# Altium footprint library PcbLib1.PcbLib: 38 footprints (part 2 of 3)
Each footprint in its own frame and in the unit in brackets; x right, y up, seen from the top. Pads: shape width x height; smd on the part's side, far side on the other; paste and mask are expansions set on the pad; w line width, h text height; cw(c..) or ccw(c..) is an arc to the next point about the centre after c.
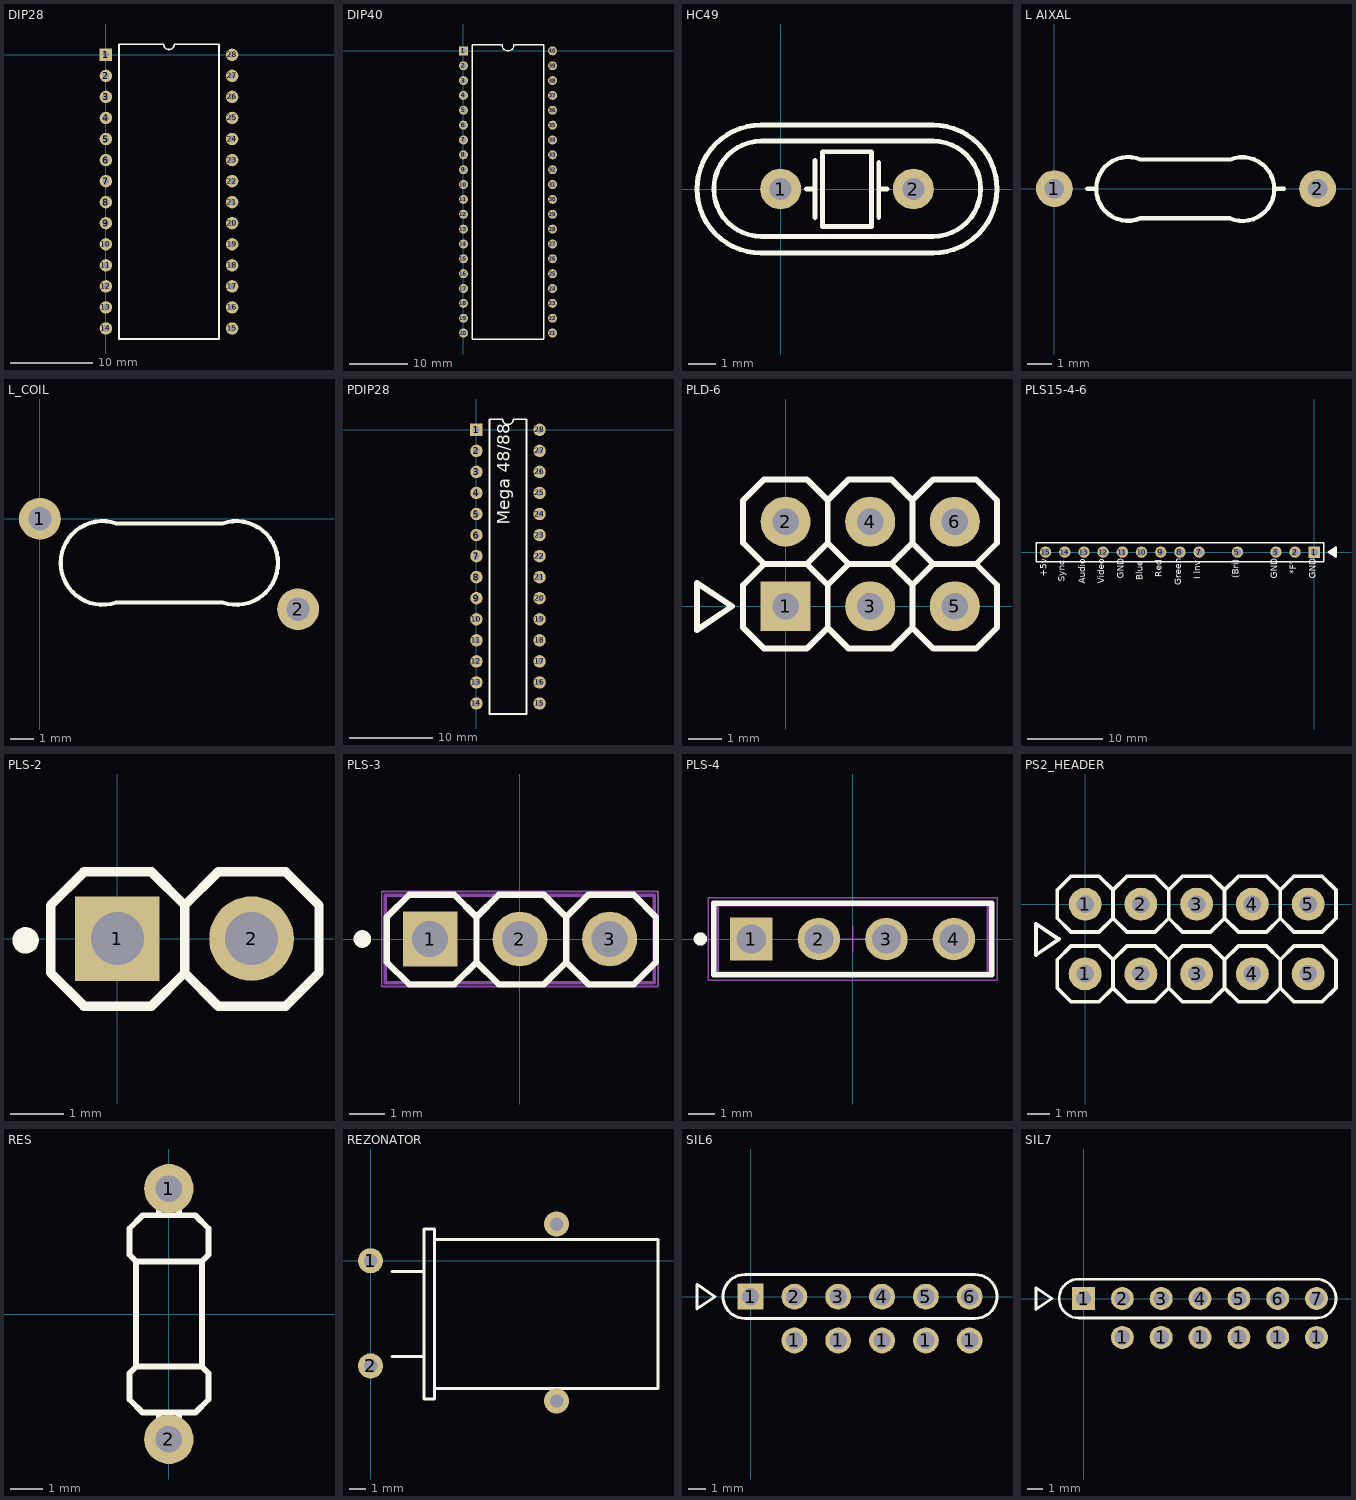
[diagram p1: the footprints below, top view; thin cyan lines are the x and y axes]

## DIP28 [mm]
pads (28):
  rect 1.5x1.5 hole 0.8: 1(0,0)
  round 1.5 hole 0.8: 2(0,-2.54) 3(0,-5.08) 4(0,-7.62) 5(0,-10.16) 6(0,-12.7) 7(0,-15.24) 8(0,-17.78) 9(0,-20.32) 10(0,-22.86) 11(0,-25.4) 12(0,-27.94) 13(0,-30.48) 14(0,-33.02) 15(15.24,-33.02) 16(15.24,-30.48) 17(15.24,-27.94) 18(15.24,-25.4) 19(15.24,-22.86) 20(15.24,-20.32) 21(15.24,-17.78) 22(15.24,-15.24) 23(15.24,-12.7) 24(15.24,-10.16) 25(15.24,-7.62) 26(15.24,-5.08) 27(15.24,-2.54) 28(15.24,0)
Top Overlay:
  lines w0.2: 1.585,-34.29 1.585,1.27 6.985,1.27 ccw(c7.62,1.27) 8.255,1.27 13.655,1.27 13.655,-34.29 1.585,-34.29

## DIP40 [mil]
pads (40):
  rect 60x60 hole 38: 1(0,0)
  round 60 hole 38: 2(0,-100) 3(0,-200) 4(0,-300) 5(0,-400) 6(0,-500) 7(0,-600) 8(0,-700) 9(0,-800) 10(0,-900) 11(0,-1000) 12(0,-1100) 13(0,-1200) 14(0,-1300) 15(0,-1400) 16(0,-1500) 17(0,-1600) 18(0,-1700) 19(0,-1800) 20(0,-1900) 21(600,-1900) 22(600,-1800) 23(600,-1700) 24(600,-1600) 25(600,-1500) 26(600,-1400) 27(600,-1300) 28(600,-1200) 29(600,-1100) 30(600,-1000) 31(600,-900) 32(600,-800) 33(600,-700) 34(600,-600) 35(600,-500) 36(600,-400) 37(600,-300) 38(600,-200) 39(600,-100) 40(600,0)
Top Overlay:
  lines w10: 60,-1940 540,-1940 540,40 340,40 cw(c300,40) 260,40 60,40 60,-1940
Top Value:
  text ".Value" at 442.76,72.73 h118.11
3D body "DIP40-600-1.step": height 203.98, standoff -122.8, extent -46.46,-1948.03 646.46,48.03

## HC49 [mm]
pads (2):
  round 1.5 hole 0.8: 1(0,0) 2(4.88,0)
Top Overlay:
  lines w0.178: 0.957,-0.002 1.26,-0.002 ; 1.27,-1.052 1.27,1.048 ; 3.607,-1.052 3.607,0.968 ; 3.617,-0.002 3.92,-0.002 ; 5.6,-2.35 ccw(c5.6,0) 5.6,2.35 -0.72,2.35 ccw(c-0.72,0) -0.72,-2.35 5.62,-2.35 ; -0.701,-1.742 cw(c-0.701,0.008) -0.701,1.758 5.599,1.758 cw(c5.599,0.008) 5.599,-1.742 -0.701,-1.742 ; 1.54,-1.373 1.54,1.368 3.337,1.368 3.337,-1.373 1.54,-1.373
3D body "User Library-HC-49_LT_THT.step": height 3.6, standoff -1.99, extent -3.212,-2.345 8.138,2.305

## L AIXAL [mm]
pads (2):
  round 1.5 hole 0.8: 1(0,0) 2(10.716,0)
Top Overlay:
  lines w0.178: 1.33,-0.007 1.67,-0.01 ; 7.148,-1.217 ccw(c7.656,-0.02) 7.169,1.185 3.508,1.187 ccw(c3,-0.01) 3.508,-1.207 7.148,-1.207 ; 9.03,-0.007 9.347,-0.007
  text ".Comment" at 3.36,-0.55 h1.1

## L_COIL [mm]
pads (2):
  round 1.8 hole 1: 1(0,0) 2(11.113,-3.889)
Top Overlay:
  lines w0.178: 3.277,-3.595 7.86,-3.595 ; 3.283,-3.6 cw(c2.697,-1.898) 3.283,-0.196 ; 3.297,-0.195 7.87,-0.195 ; 7.864,-3.6 ccw(c8.45,-1.898) 7.864,-0.196

## PDIP28 [mm]
pads (28):
  rect 1.5x1.5 hole 0.8: 1(0,0)
  round 1.5 hole 0.8: 2(0,-2.54) 3(0,-5.08) 4(0,-7.62) 5(0,-10.16) 6(0,-12.7) 7(0,-15.24) 8(0,-17.78) 9(0,-20.32) 10(0,-22.86) 11(0,-25.4) 12(0,-27.94) 13(0,-30.48) 14(0,-33.02) 15(7.62,-33.02) 16(7.62,-30.48) 17(7.62,-27.94) 18(7.62,-25.4) 19(7.62,-22.86) 20(7.62,-20.32) 21(7.62,-17.78) 22(7.62,-15.24) 23(7.62,-12.7) 24(7.62,-10.16) 25(7.62,-7.62) 26(7.62,-5.08) 27(7.62,-2.54) 28(7.62,0)
Top Overlay:
  lines w0.2: 1.585,-34.29 1.585,1.27 3.175,1.27 ccw(c3.81,1.27) 4.445,1.27 6.035,1.27 6.035,-34.29 1.585,-34.29
  text "Mega 48/88" at 4.524,-11.461 h2.54
3D body "User Library-28pin 0_3inch 2_54mm IC DIP Gold Socket.step": height 5.48, standoff -2.87, extent -1.359,-34.264 9.074,1.296

## PLD-6 [mm]
pads (6):
  rect 1.5x1.5 hole 0.8: 1(0,0)
  round 1.5 hole 0.8: 2(0,2.54) 3(2.54,0) 4(2.54,2.54) 5(5.08,0) 6(5.08,2.54)
Top Overlay:
  lines w0.178: -1.273,-0.642 -1.273,0.638 ; -1.273,-0.642 -0.643,-1.272 0.637,-1.272 1.267,-0.642 ; -1.273,-0.642 -1.273,0.638 ; -1.273,0.638 -0.643,1.268 ; -1.273,1.898 -1.273,3.178 ; -1.273,1.898 -0.643,1.268 ; -1.273,1.898 -1.273,3.178 ; -1.273,3.178 -0.643,3.808 ; -0.643,1.268 0.637,1.268 ; -0.643,1.268 0.637,1.268 ; -0.643,1.268 0.637,1.268 ; -0.643,3.808 0.637,3.808 ; -0.643,3.808 0.637,3.808 ; 0.637,1.268 1.267,1.898 ; 0.637,1.268 1.267,0.638 ; 0.637,3.808 1.267,3.178 ; 1.267,-0.642 1.267,0.638 ; 1.267,-0.642 1.897,-1.272 3.177,-1.272 3.807,-0.642 ; 1.267,-0.642 1.267,0.638 ; 1.267,-0.642 1.267,0.638 ; 1.267,0.638 1.897,1.268 ; 1.267,1.898 1.267,3.178 ; 1.267,1.898 1.897,1.268 ; 1.267,1.898 1.267,3.178 ; 1.267,1.898 1.267,3.178 ; 1.267,3.178 1.897,3.808 ; 1.897,1.268 3.177,1.268 ; 1.897,1.268 3.177,1.268 ; 1.897,1.268 3.177,1.268 ; 1.897,3.808 3.177,3.808 ; 1.897,3.808 3.177,3.808 ; 3.177,1.268 3.807,0.638 ; 3.177,1.268 3.807,1.898 ; 3.177,3.808 3.807,3.178 ; 3.807,-0.642 3.807,0.638 ; 3.807,-0.642 4.437,-1.272 5.717,-1.272 6.347,-0.642 6.347,0.638 5.717,1.268 ; 3.807,-0.642 3.807,0.638 ; 3.807,-0.642 3.807,0.638 ; 3.807,0.638 4.437,1.268 ; 3.807,1.898 3.807,3.178 ; 3.807,1.898 4.437,1.268 ; 3.807,1.898 3.807,3.178 ; 3.807,1.898 3.807,3.178 ; 3.807,3.178 4.437,3.808 ; 4.437,1.268 5.717,1.268 ; 4.437,1.268 5.717,1.268 ; 4.437,1.268 5.717,1.268 ; 4.437,3.808 5.717,3.808 ; 4.437,3.808 5.717,3.808 ; 5.717,1.268 6.347,1.898 6.347,3.178 5.717,3.808 ; -2.659,-0.72 -2.659,0.7 -1.609,0 -2.659,-0.72
3D body "5-146252-3--3DModel-STEP-1.STEP": height 10.58, standoff -2.96, extent -1.052,-1.174 6.161,3.702

## PLS15-4-6 [mm] "VIDEO"
pads (13):
  rect 1.5x1.5 hole 1: 1(0,0)
  round 1.5 hole 1: 2(-2.54,0) 3(-5.08,0) 5(-10.16,0) 7(-15.24,0) 8(-17.78,0) 9(-20.32,0) 10(-22.86,0) 11(-25.4,0) 12(-27.94,0) 13(-30.48,0) 14(-33.02,0) 15(-35.56,0)
Top Overlay:
  region: 1.829,0.011 2.879,0.711 2.879,-0.709
  lines w0.178: -36.83,-1.27 -36.83,1.27 1.27,1.27 1.27,-1.27 -36.83,-1.27 ; 1.829,0.011 2.879,0.711 2.879,-0.709 1.829,0.011
  text "GND" at 0.497,-3.494 h1.52
  text "*F'" at -2.043,-2.922 h1.52
  text "GND" at -4.583,-3.494 h1.52
  text "(Bri)" at -9.662,-3.486 h1.52
  text "I Inv" at -14.744,-3.564 h1.52
  text "Green" at -17.283,-4.415 h1.52
  text "Red" at -19.823,-3.351 h1.52
  text "Blue" at -22.363,-3.705 h1.52
  text "GND" at -24.903,-3.494 h1.52
  text "Video" at -27.443,-4.204 h1.52
  text "Audio" at -29.983,-4.204 h1.52
  text "Sync" at -32.665,-3.919 h1.52
  text "+5v" at -35.064,-3.242 h1.52
Bottom Overlay:
  text "GND" at 0.497,-1.719 h1.52
  text "*F'" at -2.043,-1.719 h1.52
  text "GND" at -4.583,-1.719 h1.52
  text "(Bri)" at -9.662,-1.72 h1.52
  text "I Inv" at -14.744,-1.719 h1.52
  text "Green" at -17.283,-1.719 h1.52
  text "Red" at -19.823,-1.719 h1.52
  text "Blue" at -22.363,-1.719 h1.52
  text "GND" at -24.903,-1.719 h1.52
  text "Video" at -27.443,-1.72 h1.52
  text "Audio" at -29.983,-1.72 h1.52
  text "Sync" at -32.665,-1.719 h1.52
  text "+5v" at -35.064,-1.719 h1.52

## PLS-2 [mm]
pads (2):
  rect 1.6x1.6 hole 1: 1(0,0)
  round 1.6 hole 1: 2(2.54,0)
Top Overlay:
  circle w0.25: c-1.737,-0.032 r0.125
  lines w0.178: 1.276,-0.647 1.276,0.633 ; 1.276,-0.647 1.906,-1.277 3.186,-1.277 3.816,-0.647 3.816,0.633 3.186,1.263 1.906,1.263 1.276,0.633 ; 1.276,-0.647 0.646,-1.277 -0.634,-1.277 -1.264,-0.647 -1.264,0.633 -0.634,1.263 0.646,1.263 1.276,0.633 ; 1.276,-0.647 1.276,0.633
3D body "User Library-PLS2.STEP": height 8.54, standoff -3, extent -1.27,-1.27 3.81,1.27

## PLS-3 [mm] "THD, 3-Leads, Body 7.62x2.49mm, Pitch 2.54mm"
height 8.38
pads (3):
  rect 1.55x1.55 hole 1.02: 1(-2.54,0)
  round 1.55 hole 1.02: 2(0,0) 3(2.54,0)
Top Overlay:
  circle w0.25: c-4.46,0 r0.125
  lines w0.178: -1.229,-0.657 -1.229,0.623 ; -1.229,-0.657 -1.859,-1.287 -3.139,-1.287 -3.769,-0.657 -3.769,0.623 -3.139,1.253 -1.859,1.253 -1.229,0.623 ; -1.229,-0.657 -0.599,-1.287 0.681,-1.287 1.311,-0.657 ; -1.229,-0.657 -1.229,0.623 ; -1.229,0.623 -0.599,1.253 0.681,1.253 1.311,0.623 ; 1.311,-0.657 1.311,0.623 ; 1.311,-0.657 1.941,-1.287 3.221,-1.287 3.851,-0.657 3.851,0.623 3.221,1.253 1.941,1.253 1.311,0.623 ; 1.311,-0.657 1.311,0.623
Mechanical 13:
  lines w0.1: -3.81,-1.245 -3.81,1.245 3.81,1.245 3.81,-1.245 -3.81,-1.245
Mechanical 15:
  lines w0.05: -3.91,-1.345 3.91,-1.345 3.91,1.345 -3.91,1.345 -3.91,-1.345
  lines w0.1: -0.5,0 0.5,0 ; 0,-0.5 0,0.5
3D body "022284033.stp": height 8.38, standoff -3.18, extent -3.81,-1.245 3.81,1.245

## PLS-4 [mm] "Pin Header, pitch 2.54 mm, THT, Vertical, single row, 4p"
height 8.54
pads (4):
  rect 1.6x1.6 hole 1.1: 1(-3.81,0)
  round 1.6 hole 1.1: 2(-1.27,0) 3(1.27,0) 4(3.81,0)
Top Overlay:
  circle w0.25: c-5.73,0 r0.125
  lines w0.2: -5.23,-1.345 -5.23,1.345 5.23,1.345 5.23,-1.345 -5.23,-1.345
Mechanical 13:
  lines w0.1: -5.08,-1.27 5.08,-1.27 5.08,1.27 -5.08,1.27 -5.08,-1.27
Mechanical 15:
  lines w0.05: -0.5,0 0.5,0 ; 0,-0.5 0,0.5 ; -5.43,-1.545 5.43,-1.545 5.43,1.545 -5.43,1.545 -5.43,-1.545
3D body "61300411121.stp": height 8.57, standoff -2.97, extent -5.08,-1.27 5.08,1.27

## PS2_HEADER [mm]
pads (10):
  round 1.5 hole 0.8: 1(0,-3.175) 1(0,0) 2(2.54,-3.175) 2(2.54,0) 3(5.08,-3.175) 3(5.08,0) 4(7.62,-3.175) 4(7.62,0) 5(10.16,-3.175) 5(10.16,0)
Top Overlay:
  lines w0.178: 1.27,-3.815 1.9,-4.445 3.18,-4.445 3.81,-3.815 ; 1.27,-3.815 1.27,-2.535 ; 1.27,-3.815 0.64,-4.445 -0.64,-4.445 -1.27,-3.815 -1.27,-2.535 -0.64,-1.905 0.64,-1.905 1.27,-2.535 ; 1.27,-3.815 1.27,-2.535 ; 1.27,-2.535 1.9,-1.905 3.18,-1.905 3.81,-2.535 ; 1.27,-0.64 1.9,-1.27 3.18,-1.27 3.81,-0.64 ; 1.27,-0.64 1.27,0.64 ; 1.27,-0.64 0.64,-1.27 -0.64,-1.27 -1.27,-0.64 -1.27,0.64 -0.64,1.27 0.64,1.27 1.27,0.64 ; 1.27,-0.64 1.27,0.64 ; 1.27,0.64 1.9,1.27 3.18,1.27 3.81,0.64 ; 3.81,-3.815 4.44,-4.445 5.72,-4.445 6.35,-3.815 ; 3.81,-3.815 3.81,-2.535 ; 3.81,-3.815 3.81,-2.535 ; 3.81,-2.535 4.44,-1.905 5.72,-1.905 6.35,-2.535 ; 3.81,-0.64 4.44,-1.27 5.72,-1.27 6.35,-0.64 ; 3.81,-0.64 3.81,0.64 ; 3.81,-0.64 3.81,0.64 ; 3.81,0.64 4.44,1.27 5.72,1.27 6.35,0.64 ; 6.35,-3.815 6.98,-4.445 8.26,-4.445 8.89,-3.815 ; 6.35,-3.815 6.35,-2.535 ; 6.35,-3.815 6.35,-2.535 ; 6.35,-2.535 6.98,-1.905 8.26,-1.905 8.89,-2.535 ; 6.35,-0.64 6.98,-1.27 8.26,-1.27 8.89,-0.64 ; 6.35,-0.64 6.35,0.64 ; 6.35,-0.64 6.35,0.64 ; 6.35,0.64 6.98,1.27 8.26,1.27 8.89,0.64 ; 8.89,-3.815 9.52,-4.445 10.8,-4.445 11.43,-3.815 11.43,-2.535 10.8,-1.905 9.52,-1.905 8.89,-2.535 ; 8.89,-3.815 8.89,-2.535 ; 8.89,-3.815 8.89,-2.535 ; 8.89,-0.64 9.52,-1.27 10.8,-1.27 11.43,-0.64 11.43,0.64 10.8,1.27 9.52,1.27 8.89,0.64 ; 8.89,-0.64 8.89,0.64 ; 8.89,-0.64 8.89,0.64 ; -2.239,-2.314 -1.199,-1.594 -2.239,-0.894 -2.239,-2.314
3D body "User Library-Header_Male_5Pin.STEP": height 8.54, standoff -3, extent -1.242,-4.37 11.458,-1.88
3D body "User Library-Header_Male_5Pin.STEP": height 8.54, standoff -3, extent -1.244,-1.164 11.456,1.326

## RES [mm]
pads (2):
  round 1.5 hole 0.8: 1(0,3.81) 2(0,-3.81)
Top Overlay:
  lines w0.178: -0.296,-3.385 -0.296,-3 ; -0.296,3 -0.296,3.386 ; 0.304,-3.385 0.304,-3 ; 0.304,3 0.304,3.386 ; -0.996,-1.6 1.004,-1.6 ; -0.996,-1.6 -1.196,-1.8 -1.196,-2.6 -0.796,-3 0.804,-3 1.204,-2.6 1.204,-1.8 1.004,-1.6 ; -0.996,-1.6 -0.996,1.6 ; -0.996,1.6 1.004,1.6 ; -0.996,1.6 -1.196,1.8 -1.196,2.6 -0.796,3 0.804,3 1.204,2.6 1.204,1.8 1.004,1.6 ; 1.004,-1.6 1.004,1.6
3D body "Ax Res 0.25.stp": height 2.27, standoff 0.27, extent -1,-3.2 1,3.2

## REZONATOR [mm]
pads (2):
  round 1.5 hole 0.8: 1(0,0) 2(0,-6.27)
via 11.097,-8.365 diameter 1.5 hole 0.8
via 11.097,2.19 diameter 1.5 hole 0.8
Top Overlay:
  lines w0.178: 1.27,-5.715 1.905,-5.715 3.175,-5.715 ; 1.27,-0.635 3.175,-0.635 ; 3.81,1.27 17.145,1.27 17.145,-7.613 3.817,-7.613 ; 3.175,-8.255 3.175,1.905 3.81,1.905 3.81,-8.255 3.175,-8.255
3D body "User Library-HC-49U.step": height 4.82, standoff 0.18, extent 1.005,-8.611 17.005,2.289

## SIL6 [mm]
pads (11):
  rect 1.5x1.5 hole 1: 1(0,0)
  round 1.5 hole 1: 1(2.54,-2.54) 1(5.08,-2.54) 1(7.62,-2.54) 1(10.16,-2.54) 1(12.7,-2.54) 2(2.54,0) 3(5.08,0) 4(7.62,0) 5(10.16,0) 6(12.7,0)
Top Overlay:
  lines w0.178: -0.329,-1.258 cw(c-0.329,0.012) -0.329,1.282 ; -0.319,-1.258 13.016,-1.258 ccw(c13.016,0.012) 13.016,1.282 -0.319,1.282 ; -3.107,-0.71 -3.107,0.71 -2.057,0 -3.107,-0.71

## SIL7 [mm]
pads (13):
  rect 1.5x1.5 hole 1: 1(0,0)
  round 1.5 hole 1: 1(2.54,-2.54) 1(5.08,-2.54) 1(7.62,-2.54) 1(10.16,-2.54) 1(12.7,-2.54) 1(15.24,-2.54) 2(2.54,0) 3(5.08,0) 4(7.62,0) 5(10.16,0) 6(12.7,0) 7(15.244,0)
Top Overlay:
  lines w0.178: -0.324,-1.27 cw(c-0.324,0) -0.324,1.27 ; -0.31,-1.27 15.247,-1.27 ; -0.31,1.27 15.247,1.27 ; 15.244,-1.27 ccw(c15.244,0) 15.244,1.27 ; -3.107,-0.71 -2.057,0 -3.107,0.71 -3.107,-0.71